# Altium footprint library connector.PcbLib: 227 footprints (part 11 of 15)
Each footprint in its own frame and in the unit in brackets; x right, y up, seen from the top. Pads: shape width x height; smd on the part's side, far side on the other; paste and mask are expansions set on the pad; w line width, h text height; cw(c..) or ccw(c..) is an arc to the next point about the centre after c.
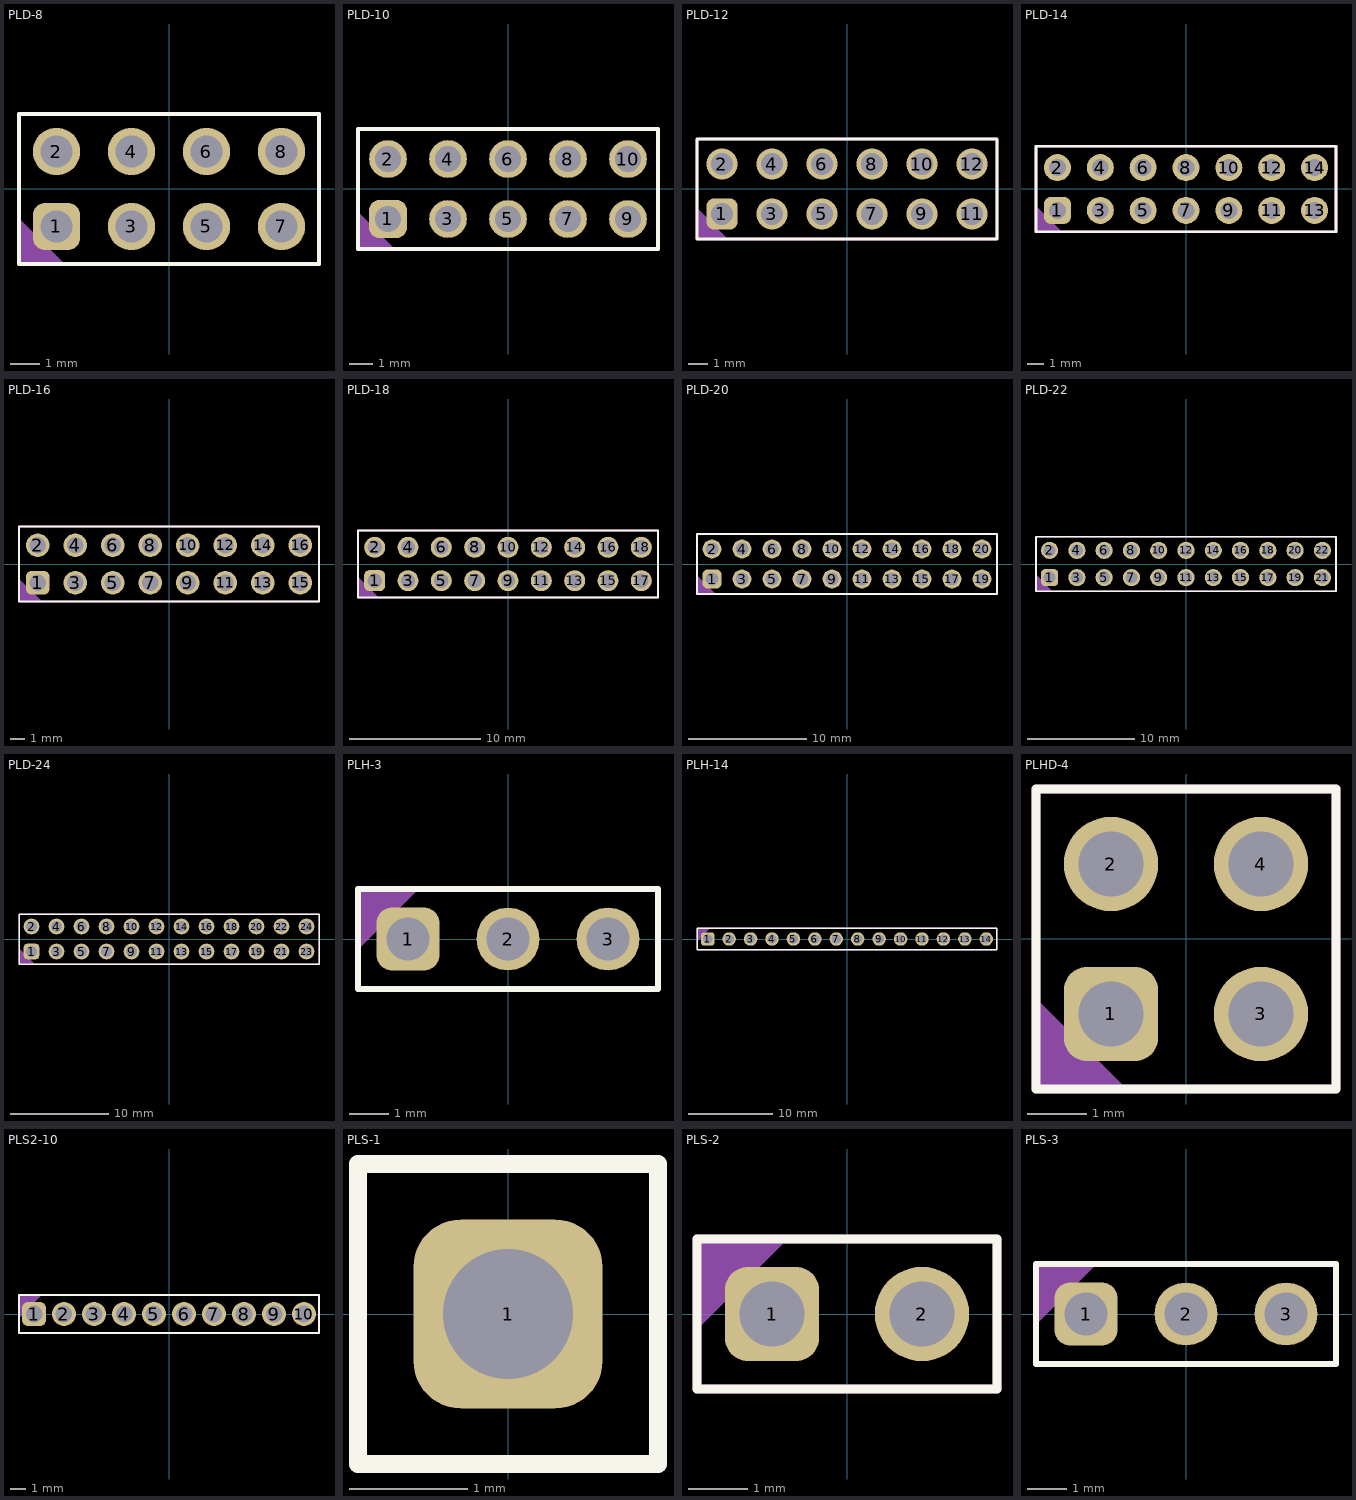
[diagram p10: the footprints below, top view; thin cyan lines are the x and y axes]

## PLD-8 [mm]
height 8
pads (8):
  rrect50% 1.6x1.6 hole 1.1: 1(-3.81,-1.27)
  round 1.6 hole 1.1: 2(-3.81,1.27) 3(-1.27,-1.27) 4(-1.27,1.27) 5(1.27,-1.27) 6(1.27,1.27) 7(3.81,-1.27) 8(3.81,1.27)
Top Overlay:
  lines w0.15: -5.08,-2.54 5.08,-2.54 5.08,2.54 -5.08,2.54 -5.08,-2.54
Mechanical 29:
  region: -5.08,-2.54 -5.08,-1.016 -3.556,-2.54
  lines w0.15: -5.08,-2.54 -5.08,2.54 5.08,2.54 5.08,-2.54 -5.08,-2.54
  text ".Designator" at -3.5,-0.3 h1
3D body "PLS-1.STEP": height 8.5, standoff -3, extent 2.54,-2.54 5.08,0
3D body "PLS-1.STEP": height 8.5, standoff -3, extent 2.54,0 5.08,2.54
3D body "PLS-1.STEP": height 8.5, standoff -3, extent 0,-2.54 2.54,0
3D body "PLS-1.STEP": height 8.5, standoff -3, extent 0,0 2.54,2.54
3D body "PLS-1.STEP": height 8.5, standoff -3, extent -2.54,-2.54 0,0
3D body "PLS-1.STEP": height 8.5, standoff -3, extent -2.54,0 0,2.54
3D body "PLS-1.STEP": height 8.5, standoff -3, extent -5.08,0 -2.54,2.54
3D body "PLS-1.STEP": height 8.5, standoff -3, extent -5.08,-2.54 -2.54,0

## PLD-10 [mm]
height 8.5
pads (10):
  rrect50% 1.6x1.6 hole 1.1: 1(-5.08,-1.27)
  round 1.6 hole 1.1: 2(-5.08,1.27) 3(-2.54,-1.27) 4(-2.54,1.27) 5(0,-1.27) 6(0,1.27) 7(2.54,-1.27) 8(2.54,1.27) 9(5.08,-1.27) 10(5.08,1.27)
Top Overlay:
  lines w0.15: -6.35,-2.54 6.35,-2.54 6.35,2.54 -6.35,2.54 -6.35,-2.54
Mechanical 29:
  region: -6.35,-2.5 -6.35,-0.976 -4.826,-2.5
  lines w0.15: -6.35,-2.54 -6.35,2.54 6.35,2.54 6.35,-2.54 -6.35,-2.54
  text ".Designator" at -3,-0.3 h1
3D body "PLS-1.STEP": height 8.5, standoff -3, extent 3.81,-2.54 6.35,0
3D body "PLS-1.STEP": height 8.5, standoff -3, extent 3.81,0 6.35,2.54
3D body "PLS-1.STEP": height 8.5, standoff -3, extent 1.27,-2.54 3.81,0
3D body "PLS-1.STEP": height 8.5, standoff -3, extent 1.27,0 3.81,2.54
3D body "PLS-1.STEP": height 8.5, standoff -3, extent -1.27,-2.54 1.27,0
3D body "PLS-1.STEP": height 8.5, standoff -3, extent -1.27,0 1.27,2.54
3D body "PLS-1.STEP": height 8.5, standoff -3, extent -3.81,-2.54 -1.27,0
3D body "PLS-1.STEP": height 8.5, standoff -3, extent -3.81,0 -1.27,2.54
3D body "PLS-1.STEP": height 8.5, standoff -3, extent -6.35,0 -3.81,2.54
3D body "PLS-1.STEP": height 8.5, standoff -3, extent -6.35,-2.54 -3.81,0

## PLD-12 [mm]
height 8
pads (12):
  rrect50% 1.6x1.6 hole 1.1: 1(-6.35,-1.27)
  round 1.6 hole 1.1: 2(-6.35,1.27) 3(-3.81,-1.27) 4(-3.81,1.27) 5(-1.27,-1.27) 6(-1.27,1.27) 7(1.27,-1.27) 8(1.27,1.27) 9(3.81,-1.27) 10(3.81,1.27) 11(6.35,-1.27) 12(6.35,1.27)
Top Overlay:
  lines w0.15: -7.62,-2.54 -7.62,2.54 7.62,2.54 7.62,-2.54 -7.62,-2.54
Mechanical 29:
  region: -7.62,-2.5 -7.62,-0.976 -6.096,-2.5
  lines w0.15: -7.62,-2.54 7.62,-2.54 7.62,2.54 -7.62,2.54 -7.62,-2.54
  text ".Designator" at -3,0.2 h1
3D body "PLS-1.STEP": height 8.5, standoff -3, extent -7.62,-2.54 -5.08,0
3D body "PLS-1.STEP": height 8.5, standoff -3, extent -7.62,0 -5.08,2.54
3D body "PLS-1.STEP": height 8.5, standoff -3, extent -5.08,0 -2.54,2.54
3D body "PLS-1.STEP": height 8.5, standoff -3, extent -5.08,-2.54 -2.54,0
3D body "PLS-1.STEP": height 8.5, standoff -3, extent -2.54,0 0,2.54
3D body "PLS-1.STEP": height 8.5, standoff -3, extent -2.54,-2.54 0,0
3D body "PLS-1.STEP": height 8.5, standoff -3, extent 0,0 2.54,2.54
3D body "PLS-1.STEP": height 8.5, standoff -3, extent 0,-2.54 2.54,0
3D body "PLS-1.STEP": height 8.5, standoff -3, extent 2.54,0 5.08,2.54
3D body "PLS-1.STEP": height 8.5, standoff -3, extent 2.54,-2.54 5.08,0
3D body "PLS-1.STEP": height 8.5, standoff -3, extent 5.08,0 7.62,2.54
3D body "PLS-1.STEP": height 8.5, standoff -3, extent 5.08,-2.54 7.62,0

## PLD-14 [mm]
height 8
pads (14):
  rrect50% 1.6x1.6 hole 1: 1(-7.62,-1.27)
  round 1.6 hole 1: 2(-7.62,1.27) 3(-5.08,-1.27) 4(-5.08,1.27) 5(-2.54,-1.27) 6(-2.54,1.27) 7(0,-1.27) 8(0,1.27) 9(2.54,-1.27) 10(2.54,1.27) 11(5.08,-1.27) 12(5.08,1.27) 13(7.62,-1.27) 14(7.62,1.27)
Top Overlay:
  lines w0.15: -8.89,-2.54 -8.89,2.54 8.89,2.54 8.89,-2.54 -8.89,-2.54
Mechanical 29:
  region: -8.89,-2.54 -8.89,-1.016 -7.366,-2.54
  lines w0.15: -8.89,-2.54 8.89,-2.54 8.89,2.54 -8.89,2.54 -8.89,-2.54
  text ".Designator" at -3.5,-0.3 h1
3D body "PLS-1.STEP": height 8.5, standoff -3, extent -8.89,-2.54 -6.35,0
3D body "PLS-1.STEP": height 8.5, standoff -3, extent -8.89,0 -6.35,2.54
3D body "PLS-1.STEP": height 8.5, standoff -3, extent -6.35,0 -3.81,2.54
3D body "PLS-1.STEP": height 8.5, standoff -3, extent -6.35,-2.54 -3.81,0
3D body "PLS-1.STEP": height 8.5, standoff -3, extent -3.81,0 -1.27,2.54
3D body "PLS-1.STEP": height 8.5, standoff -3, extent -3.81,-2.54 -1.27,0
3D body "PLS-1.STEP": height 8.5, standoff -3, extent -1.27,0 1.27,2.54
3D body "PLS-1.STEP": height 8.5, standoff -3, extent -1.27,-2.54 1.27,0
3D body "PLS-1.STEP": height 8.5, standoff -3, extent 1.27,0 3.81,2.54
3D body "PLS-1.STEP": height 8.5, standoff -3, extent 1.27,-2.54 3.81,0
3D body "PLS-1.STEP": height 8.5, standoff -3, extent 3.81,0 6.35,2.54
3D body "PLS-1.STEP": height 8.5, standoff -3, extent 3.81,-2.54 6.35,0
3D body "PLS-1.STEP": height 8.5, standoff -3, extent 6.35,0 8.89,2.54
3D body "PLS-1.STEP": height 8.5, standoff -3, extent 6.35,-2.54 8.89,0

## PLD-16 [mm]
height 8
pads (16):
  rrect50% 1.6x1.6 hole 1.1: 1(-8.89,-1.27)
  round 1.6 hole 1.1: 2(-8.89,1.27) 3(-6.35,-1.27) 4(-6.35,1.27) 5(-3.81,-1.27) 6(-3.81,1.27) 7(-1.27,-1.27) 8(-1.27,1.27) 9(1.27,-1.27) 10(1.27,1.27) 11(3.81,-1.27) 12(3.81,1.27) 13(6.35,-1.27) 14(6.35,1.27) 15(8.89,-1.27) 16(8.89,1.27)
Top Overlay:
  lines w0.15: -10.16,-2.54 -10.16,2.54 10.16,2.54 10.16,-2.54 -10.16,-2.54
Mechanical 29:
  region: -10.16,-2.54 -10.16,-1.016 -8.636,-2.54
  lines w0.15: -10.16,-2.54 10.16,-2.54 10.16,2.54 -10.16,2.54 -10.16,-2.54
  text ".Designator" at -2.5,-0.3 h1
3D body "PLS-1.STEP": height 8.5, standoff -3, extent -10.16,-2.54 -7.62,0
3D body "PLS-1.STEP": height 8.5, standoff -3, extent -10.16,0 -7.62,2.54
3D body "PLS-1.STEP": height 8.5, standoff -3, extent -7.62,0 -5.08,2.54
3D body "PLS-1.STEP": height 8.5, standoff -3, extent -7.62,-2.54 -5.08,0
3D body "PLS-1.STEP": height 8.5, standoff -3, extent -5.08,0 -2.54,2.54
3D body "PLS-1.STEP": height 8.5, standoff -3, extent -5.08,-2.54 -2.54,0
3D body "PLS-1.STEP": height 8.5, standoff -3, extent -2.54,0 0,2.54
3D body "PLS-1.STEP": height 8.5, standoff -3, extent -2.54,-2.54 0,0
3D body "PLS-1.STEP": height 8.5, standoff -3, extent 0,0 2.54,2.54
3D body "PLS-1.STEP": height 8.5, standoff -3, extent 0,-2.54 2.54,0
3D body "PLS-1.STEP": height 8.5, standoff -3, extent 2.54,0 5.08,2.54
3D body "PLS-1.STEP": height 8.5, standoff -3, extent 2.54,-2.54 5.08,0
3D body "PLS-1.STEP": height 8.5, standoff -3, extent 5.08,0 7.62,2.54
3D body "PLS-1.STEP": height 8.5, standoff -3, extent 7.62,0 10.16,2.54
3D body "PLS-1.STEP": height 8.5, standoff -3, extent 7.62,-2.54 10.16,0
3D body "PLS-1.STEP": height 8.5, standoff -3, extent 5.08,-2.54 7.62,0

## PLD-18 [mm]
height 8
pads (18):
  rrect50% 1.6x1.6 hole 1.1: 1(-10.16,-1.27)
  round 1.6 hole 1.1: 2(-10.16,1.27) 3(-7.62,-1.27) 4(-7.62,1.27) 5(-5.08,-1.27) 6(-5.08,1.27) 7(-2.54,-1.27) 8(-2.54,1.27) 9(0,-1.27) 10(0,1.27) 11(2.54,-1.27) 12(2.54,1.27) 13(5.08,-1.27) 14(5.08,1.27) 15(7.62,-1.27) 16(7.62,1.27) 17(10.16,-1.27) 18(10.16,1.27)
Top Overlay:
  lines w0.15: -11.43,-2.54 -11.43,2.54 11.43,2.54 11.43,-2.54 -11.43,-2.54
Mechanical 29:
  region: -11.43,-2.54 -11.43,-1.016 -9.906,-2.54
  lines w0.15: -11.43,-2.54 11.43,-2.54 11.43,2.54 -11.43,2.54 -11.43,-2.54
  text ".Designator" at -3,-0.3 h1
3D body "PLS-1.STEP": height 8.5, standoff -3, extent -11.43,-2.54 -8.89,0
3D body "PLS-1.STEP": height 8.5, standoff -3, extent -11.43,0 -8.89,2.54
3D body "PLS-1.STEP": height 8.5, standoff -3, extent -8.89,0 -6.35,2.54
3D body "PLS-1.STEP": height 8.5, standoff -3, extent -8.89,-2.54 -6.35,0
3D body "PLS-1.STEP": height 8.5, standoff -3, extent -6.35,0 -3.81,2.54
3D body "PLS-1.STEP": height 8.5, standoff -3, extent -6.35,-2.54 -3.81,0
3D body "PLS-1.STEP": height 8.5, standoff -3, extent -3.81,0 -1.27,2.54
3D body "PLS-1.STEP": height 8.5, standoff -3, extent -3.81,-2.54 -1.27,0
3D body "PLS-1.STEP": height 8.5, standoff -3, extent -1.27,0 1.27,2.54
3D body "PLS-1.STEP": height 8.5, standoff -3, extent -1.27,-2.54 1.27,0
3D body "PLS-1.STEP": height 8.5, standoff -3, extent 1.27,0 3.81,2.54
3D body "PLS-1.STEP": height 8.5, standoff -3, extent 1.27,-2.54 3.81,0
3D body "PLS-1.STEP": height 8.5, standoff -3, extent 3.81,0 6.35,2.54
3D body "PLS-1.STEP": height 8.5, standoff -3, extent 6.35,0 8.89,2.54
3D body "PLS-1.STEP": height 8.5, standoff -3, extent 8.89,0 11.43,2.54
3D body "PLS-1.STEP": height 8.5, standoff -3, extent 8.89,-2.54 11.43,0
3D body "PLS-1.STEP": height 8.5, standoff -3, extent 6.35,-2.54 8.89,0
3D body "PLS-1.STEP": height 8.5, standoff -3, extent 3.81,-2.54 6.35,0

## PLD-20 [mm]
height 8
pads (20):
  rrect50% 1.6x1.6 hole 1.1: 1(-11.43,-1.27)
  round 1.6 hole 1.1: 2(-11.43,1.27) 3(-8.89,-1.27) 4(-8.89,1.27) 5(-6.35,-1.27) 6(-6.35,1.27) 7(-3.81,-1.27) 8(-3.81,1.27) 9(-1.27,-1.27) 10(-1.27,1.27) 11(1.27,-1.27) 12(1.27,1.27) 13(3.81,-1.27) 14(3.81,1.27) 15(6.35,-1.27) 16(6.35,1.27) 17(8.89,-1.27) 18(8.89,1.27) 19(11.43,-1.27) 20(11.43,1.27)
Top Overlay:
  lines w0.15: -12.7,-2.54 -12.7,2.54 12.7,2.54 12.7,-2.54 -12.7,-2.54
Mechanical 29:
  region: -12.7,-2.54 -12.7,-1.016 -11.176,-2.54
  lines w0.15: -12.7,-2.54 12.7,-2.54 12.7,2.54 -12.7,2.54 -12.7,-2.54
  text ".Designator" at -4,-0.3 h1
3D body "PLS-1.STEP": height 8.5, standoff -3, extent -12.7,-2.54 -10.16,0
3D body "PLS-1.STEP": height 8.5, standoff -3, extent -12.7,0 -10.16,2.54
3D body "PLS-1.STEP": height 8.5, standoff -3, extent -10.16,0 -7.62,2.54
3D body "PLS-1.STEP": height 8.5, standoff -3, extent -10.16,-2.54 -7.62,0
3D body "PLS-1.STEP": height 8.5, standoff -3, extent -7.62,0 -5.08,2.54
3D body "PLS-1.STEP": height 8.5, standoff -3, extent -7.62,-2.54 -5.08,0
3D body "PLS-1.STEP": height 8.5, standoff -3, extent -5.08,0 -2.54,2.54
3D body "PLS-1.STEP": height 8.5, standoff -3, extent -5.08,-2.54 -2.54,0
3D body "PLS-1.STEP": height 8.5, standoff -3, extent -2.54,0 0,2.54
3D body "PLS-1.STEP": height 8.5, standoff -3, extent -2.54,-2.54 0,0
3D body "PLS-1.STEP": height 8.5, standoff -3, extent 0,0 2.54,2.54
3D body "PLS-1.STEP": height 8.5, standoff -3, extent 0,-2.54 2.54,0
3D body "PLS-1.STEP": height 8.5, standoff -3, extent 2.54,0 5.08,2.54
3D body "PLS-1.STEP": height 8.5, standoff -3, extent 5.08,0 7.62,2.54
3D body "PLS-1.STEP": height 8.5, standoff -3, extent 7.62,0 10.16,2.54
3D body "PLS-1.STEP": height 8.5, standoff -3, extent 10.16,0 12.7,2.54
3D body "PLS-1.STEP": height 8.5, standoff -3, extent 10.16,-2.54 12.7,0
3D body "PLS-1.STEP": height 8.5, standoff -3, extent 7.62,-2.54 10.16,0
3D body "PLS-1.STEP": height 8.5, standoff -3, extent 5.08,-2.54 7.62,0
3D body "PLS-1.STEP": height 8.5, standoff -3, extent 2.54,-2.54 5.08,0

## PLD-22 [mm]
height 8
pads (22):
  rrect50% 1.6x1.6 hole 1.1: 1(-12.7,-1.27)
  round 1.6 hole 1.1: 2(-12.7,1.27) 3(-10.16,-1.27) 4(-10.16,1.27) 5(-7.62,-1.27) 6(-7.62,1.27) 7(-5.08,-1.27) 8(-5.08,1.27) 9(-2.54,-1.27) 10(-2.54,1.27) 11(0,-1.27) 12(0,1.27) 13(2.54,-1.27) 14(2.54,1.27) 15(5.08,-1.27) 16(5.08,1.27) 17(7.62,-1.27) 18(7.62,1.27) 19(10.16,-1.27) 20(10.16,1.27) 21(12.7,-1.27) 22(12.7,1.27)
Top Overlay:
  lines w0.15: -13.97,-2.54 13.97,-2.54 13.97,2.54 -13.97,2.54 -13.97,-2.54
Mechanical 29:
  region: -13.97,-2.54 -13.97,-1.016 -12.446,-2.54
  lines w0.15: -13.97,-2.54 -13.97,2.54 13.97,2.54 13.97,-2.54 -13.97,-2.54
  text ".Designator" at -3.5,-0.3 h1
3D body "PLS-1.STEP": height 8.5, standoff -3, extent 1.27,-2.54 3.81,0
3D body "PLS-1.STEP": height 8.5, standoff -3, extent 3.81,-2.54 6.35,0
3D body "PLS-1.STEP": height 8.5, standoff -3, extent 6.35,-2.54 8.89,0
3D body "PLS-1.STEP": height 8.5, standoff -3, extent 8.89,-2.54 11.43,0
3D body "PLS-1.STEP": height 8.5, standoff -3, extent 11.43,-2.54 13.97,0
3D body "PLS-1.STEP": height 8.5, standoff -3, extent 11.43,0 13.97,2.54
3D body "PLS-1.STEP": height 8.5, standoff -3, extent 8.89,0 11.43,2.54
3D body "PLS-1.STEP": height 8.5, standoff -3, extent 6.35,0 8.89,2.54
3D body "PLS-1.STEP": height 8.5, standoff -3, extent 3.81,0 6.35,2.54
3D body "PLS-1.STEP": height 8.5, standoff -3, extent 1.27,0 3.81,2.54
3D body "PLS-1.STEP": height 8.5, standoff -3, extent -1.27,-2.54 1.27,0
3D body "PLS-1.STEP": height 8.5, standoff -3, extent -1.27,0 1.27,2.54
3D body "PLS-1.STEP": height 8.5, standoff -3, extent -3.81,-2.54 -1.27,0
3D body "PLS-1.STEP": height 8.5, standoff -3, extent -3.81,0 -1.27,2.54
3D body "PLS-1.STEP": height 8.5, standoff -3, extent -6.35,-2.54 -3.81,0
3D body "PLS-1.STEP": height 8.5, standoff -3, extent -6.35,0 -3.81,2.54
3D body "PLS-1.STEP": height 8.5, standoff -3, extent -8.89,-2.54 -6.35,0
3D body "PLS-1.STEP": height 8.5, standoff -3, extent -8.89,0 -6.35,2.54
3D body "PLS-1.STEP": height 8.5, standoff -3, extent -11.43,-2.54 -8.89,0
3D body "PLS-1.STEP": height 8.5, standoff -3, extent -11.43,0 -8.89,2.54
3D body "PLS-1.STEP": height 8.5, standoff -3, extent -13.97,0 -11.43,2.54
3D body "PLS-1.STEP": height 8.5, standoff -3, extent -13.97,-2.54 -11.43,0

## PLD-24 [mm]
height 8
pads (24):
  rrect50% 1.6x1.6 hole 1.1: 1(-13.97,-1.27)
  round 1.6 hole 1.1: 2(-13.97,1.27) 3(-11.43,-1.27) 4(-11.43,1.27) 5(-8.89,-1.27) 6(-8.89,1.27) 7(-6.35,-1.27) 8(-6.35,1.27) 9(-3.81,-1.27) 10(-3.81,1.27) 11(-1.27,-1.27) 12(-1.27,1.27) 13(1.27,-1.27) 14(1.27,1.27) 15(3.81,-1.27) 16(3.81,1.27) 17(6.35,-1.27) 18(6.35,1.27) 19(8.89,-1.27) 20(8.89,1.27) 21(11.43,-1.27) 22(11.43,1.27) 23(13.97,-1.27) 24(13.97,1.27)
Top Overlay:
  lines w0.15: -15.24,-2.54 15.24,-2.54 15.24,2.54 -15.24,2.54 -15.24,-2.54
Mechanical 29:
  region: -15.24,-2.5 -15.24,-0.976 -13.716,-2.5
  lines w0.15: -15.24,-2.54 -15.24,2.54 15.24,2.54 15.24,-2.54 -15.24,-2.54
3D body "PLS-1.STEP": height 8.5, standoff -3, extent 0,-2.54 2.54,0
3D body "PLS-1.STEP": height 8.5, standoff -3, extent 2.54,-2.54 5.08,0
3D body "PLS-1.STEP": height 8.5, standoff -3, extent 5.08,-2.54 7.62,0
3D body "PLS-1.STEP": height 8.5, standoff -3, extent 7.62,-2.54 10.16,0
3D body "PLS-1.STEP": height 8.5, standoff -3, extent 10.16,-2.54 12.7,0
3D body "PLS-1.STEP": height 8.5, standoff -3, extent 12.7,-2.54 15.24,0
3D body "PLS-1.STEP": height 8.5, standoff -3, extent 12.7,0 15.24,2.54
3D body "PLS-1.STEP": height 8.5, standoff -3, extent 10.16,0 12.7,2.54
3D body "PLS-1.STEP": height 8.5, standoff -3, extent 7.62,0 10.16,2.54
3D body "PLS-1.STEP": height 8.5, standoff -3, extent 5.08,0 7.62,2.54
3D body "PLS-1.STEP": height 8.5, standoff -3, extent 2.54,0 5.08,2.54
3D body "PLS-1.STEP": height 8.5, standoff -3, extent 0,0 2.54,2.54
3D body "PLS-1.STEP": height 8.5, standoff -3, extent -2.54,-2.54 0,0
3D body "PLS-1.STEP": height 8.5, standoff -3, extent -2.54,0 0,2.54
3D body "PLS-1.STEP": height 8.5, standoff -3, extent -5.08,-2.54 -2.54,0
3D body "PLS-1.STEP": height 8.5, standoff -3, extent -5.08,0 -2.54,2.54
3D body "PLS-1.STEP": height 8.5, standoff -3, extent -7.62,-2.54 -5.08,0
3D body "PLS-1.STEP": height 8.5, standoff -3, extent -7.62,0 -5.08,2.54
3D body "PLS-1.STEP": height 8.5, standoff -3, extent -10.16,-2.54 -7.62,0
3D body "PLS-1.STEP": height 8.5, standoff -3, extent -10.16,0 -7.62,2.54
3D body "PLS-1.STEP": height 8.5, standoff -3, extent -12.7,-2.54 -10.16,0
3D body "PLS-1.STEP": height 8.5, standoff -3, extent -12.7,0 -10.16,2.54
3D body "PLS-1.STEP": height 8.5, standoff -3, extent -15.24,0 -12.7,2.54
3D body "PLS-1.STEP": height 8.5, standoff -3, extent -15.24,-2.54 -12.7,0

## PLH-3 [mm]
pads (3):
  rrect50% 1.6x1.6 hole 1.1: 1(-2.54,0)
  round 1.6 hole 1.1: 2(0,0) 3(2.54,0)
Top Overlay:
  lines w0.15: -3.81,-1.27 3.81,-1.27 3.81,1.27 -3.81,1.27 -3.81,-1.27
Mechanical 29:
  region: -3.81,1.27 -2.286,1.27 -3.81,-0.254
  lines w0.15: -3.81,-1.27 -3.81,1.27 3.81,1.27 3.81,-1.27 -3.81,-1.27
  text ".Designator" at -3,-0.3 h1
3D body "PLH-3.stp": height 16.5, standoff -3, extent -3.81,-1.27 3.81,1.27

## PLH-14 [mm]
pads (14):
  rrect50% 1.6x1.6 hole 1.1: 1(-16.51,0)
  round 1.6 hole 1.1: 2(-13.97,0) 3(-11.43,0) 4(-8.89,0) 5(-6.35,0) 6(-3.81,0) 7(-1.27,0) 8(1.27,0) 9(3.81,0) 10(6.35,0) 11(8.89,0) 12(11.43,0) 13(13.97,0) 14(16.51,0)
Top Overlay:
  lines w0.15: -17.78,-1.27 -17.78,1.27 17.78,1.27 17.78,-1.27 -17.78,-1.27
Mechanical 29:
  region: -17.78,1.27 -16.256,1.27 -17.78,-0.254
  lines w0.15: -17.78,-1.27 17.78,-1.27 17.78,1.27 -17.78,1.27 -17.78,-1.27
  text ".Designator" at -3.5,-0.3 h1
3D body "PLH-14.stp": height 16.5, standoff -3, extent -17.78,-1.27 17.78,1.27

## PLHD-4 [mm]
pads (4):
  rrect50% 1.6x1.6 hole 1.1: 1(-1.27,-1.27)
  round 1.6 hole 1.1: 2(-1.27,1.27) 3(1.27,-1.27) 4(1.27,1.27)
Top Overlay:
  lines w0.15: -2.54,-2.54 2.54,-2.54 2.54,2.54 -2.54,2.54 -2.54,-2.54
Mechanical 29:
  region: -2.54,-2.54 -2.54,-1.016 -1.016,-2.54
  lines w0.15: -2.54,-2.54 -2.54,2.54 2.54,2.54 2.54,-2.54 -2.54,-2.54
  text ".Designator" at -2,-0.3 h1
3D body "PLHD-4.stp": height 16.5, standoff -3, extent -2.54,-2.54 2.54,2.54

## PLS2-10 [mm]
pads (10):
  rrect50% 1.6x1.6 hole 1.1: 1(-9,0)
  round 1.6 hole 1.1: 2(-7,0) 3(-5,0) 4(-3,0) 5(-1,0) 6(1,0) 7(3,0) 8(5,0) 9(7,0) 10(9,0)
Top Overlay:
  lines w0.15: -10,-1.27 -10,1.27 10,1.27 10,-1.27 -10,-1.27
Mechanical 29:
  region: -10,1.27 -8.476,1.27 -10,-0.254
  lines w0.15: -10,-1.27 10,-1.27 10,1.27 -10,1.27 -10,-1.27
  text ".Designator" at -3.5,-0.8 h1

## PLS-1 [mm]
pads (1):
  rrect50% 1.6x1.6 hole 1.1: 1(0,0)
Top Overlay:
  lines w0.15: -1.27,-1.27 -1.27,1.27 1.27,1.27 1.27,-1.27 -1.27,-1.27
Mechanical 29:
  lines w0.15: -1.27,-1.27 1.27,-1.27 1.27,1.27 -1.27,1.27 -1.27,-1.27
3D body "DS1021-1x1SF11.stp": height 8.6, standoff -3, extent -1.27,-1.27 1.27,1.27

## PLS-2 [mm]
pads (2):
  rrect50% 1.6x1.6 hole 1.1: 1(-1.27,0)
  round 1.6 hole 1.1: 2(1.27,0)
Top Overlay:
  lines w0.15: -2.54,-1.27 -2.54,1.27 2.54,1.27 2.54,-1.27 -2.54,-1.27
Mechanical 29:
  region: -2.54,1.27 -1.016,1.27 -2.54,-0.254
  lines w0.15: -2.54,-1.27 2.54,-1.27 2.54,1.27 -2.54,1.27 -2.54,-1.27
  text ".Designator" at -1.5,-0.8 h1
3D body "PLS-1.STEP": height 8.5, standoff -3, extent -2.54,-1.27 0,1.27
3D body "PLS-1.STEP": height 8.5, standoff -3, extent 0,-1.27 2.54,1.27

## PLS-3 [mm]
pads (3):
  rrect50% 1.6x1.6 hole 1.1: 1(-2.54,0)
  round 1.6 hole 1.1: 2(0,0) 3(2.54,0)
Top Overlay:
  lines w0.15: -3.81,-1.27 -3.81,1.27 3.81,1.27 3.81,-1.27 -3.81,-1.27
Mechanical 29:
  region: -3.81,1.27 -2.286,1.27 -3.81,-0.254
  lines w0.15: -3.81,-1.27 3.81,-1.27 3.81,1.27 -3.81,1.27 -3.81,-1.27
  text ".Designator" at -3,-0.3 h1
3D body "PLS-1.STEP": height 8.5, standoff -3, extent -3.81,-1.27 -1.27,1.27
3D body "PLS-1.STEP": height 8.5, standoff -3, extent -1.27,-1.27 1.27,1.27
3D body "PLS-1.STEP": height 8.5, standoff -3, extent 1.27,-1.27 3.81,1.27